# Altium footprint library Atlan.PcbLib: 283 footprints (part 15 of 18)
Each footprint in its own frame and in the unit in brackets; x right, y up, seen from the top. Pads: shape width x height; smd on the part's side, far side on the other; paste and mask are expansions set on the pad; w line width, h text height; cw(c..) or ccw(c..) is an arc to the next point about the centre after c.
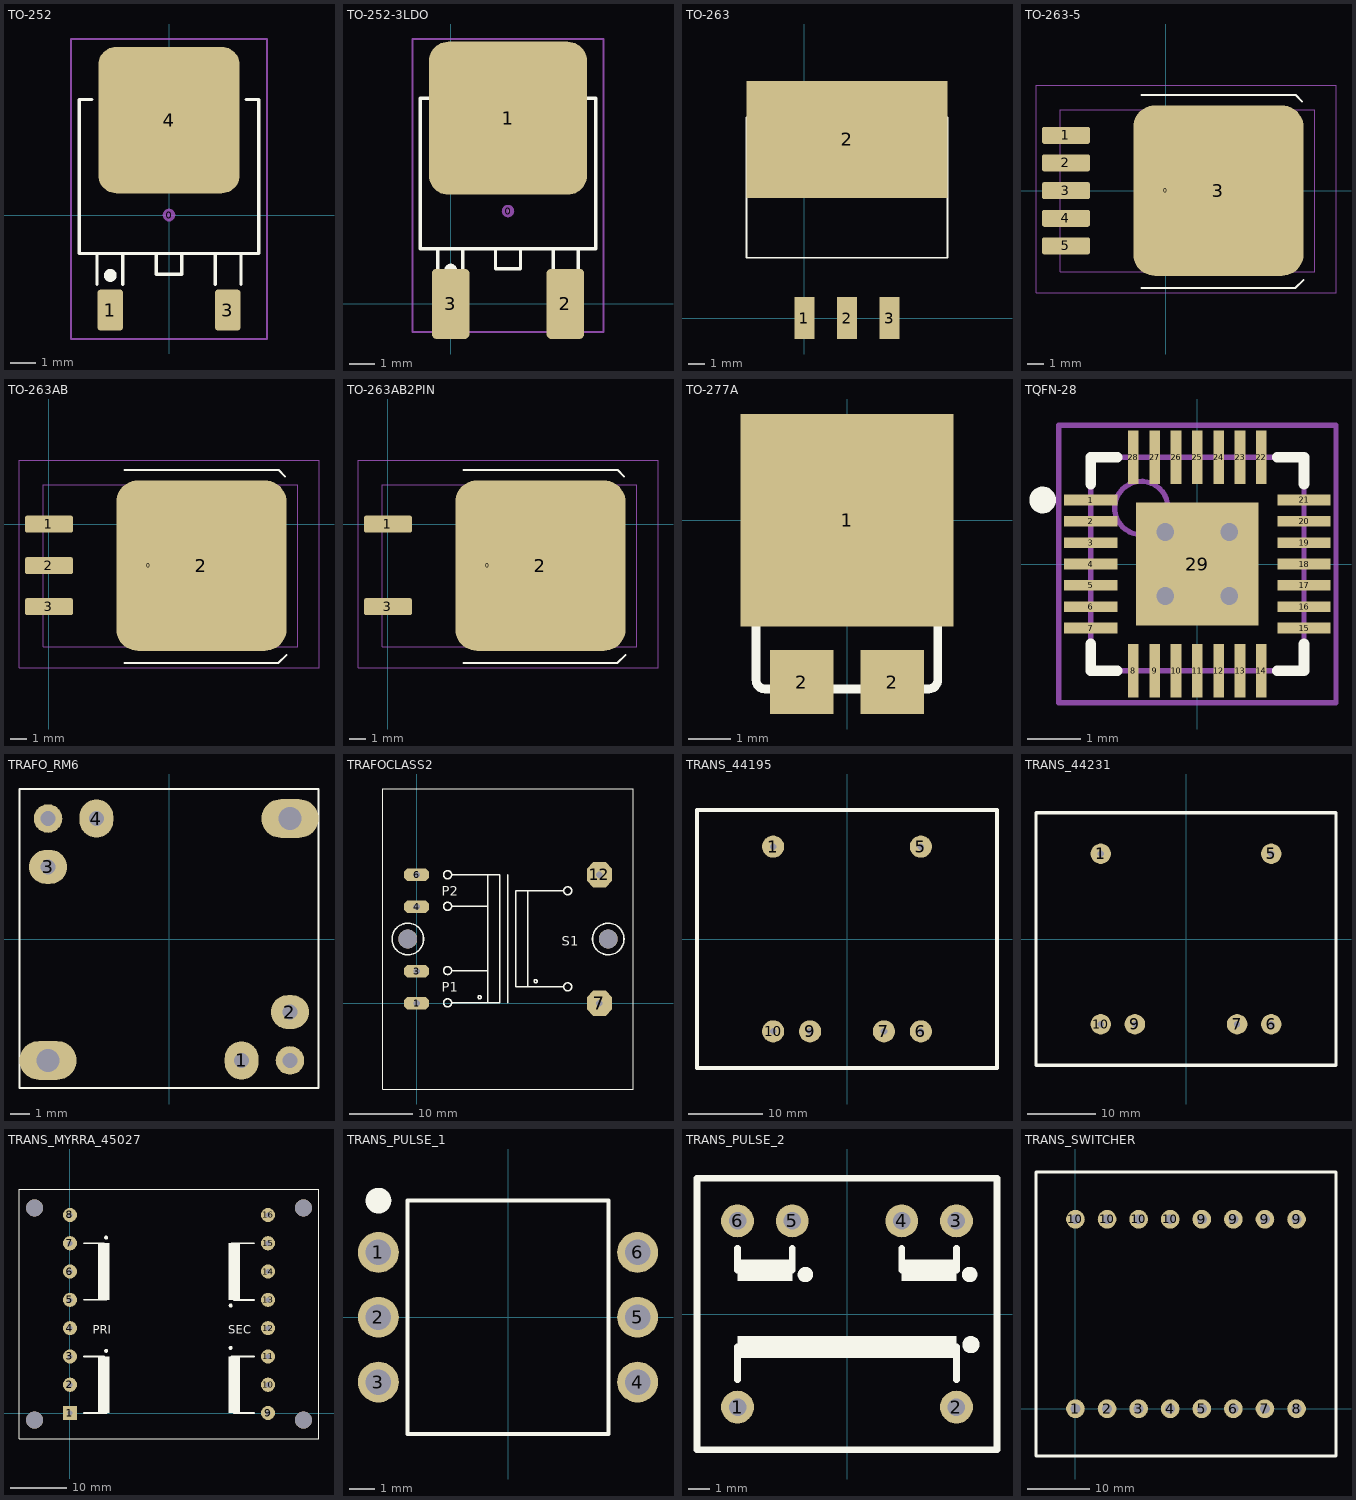
[diagram p14: the footprints below, top view; thin cyan lines are the x and y axes]

## TO-252 [mm] "D-PAK/TO-252-AA; 3 Leads (1 Cropped); Body 10.3 (inc. leads) x 6.7 mm (LxW max)"
height 2.38
pads (4):
  round 0.5 on Mech15: 0(0,0)
  rrect25% 1x1.6 smd: 1(-2.285,-3.7) 3(2.285,-3.7)
  rrect25% 5.5x5.7 smd: 4(0,3.7)
Top Overlay:
  circle w0.25: c-2.285,-2.35 r0.125
  lines w0.127: -3,4.5 -3.5,4.5 -3.5,-1.5 3.5,-1.5 3.5,4.5 3,4.5 ; -2.8,-2.7 -2.8,-1.5 -1.8,-1.5 -1.8,-2.7 ; 1.8,-2.7 1.8,-1.5 2.8,-1.5 2.8,-2.7 ; -0.5,-2.3 -0.5,-1.5 0.5,-1.5 0.5,-2.3 -0.5,-2.3
Mechanical 15:
  lines w0.076: -3.81,-4.826 -3.81,6.858 3.81,6.858 3.81,-4.826 -3.81,-4.826
3D body "DPAK.stp": height 2.31, standoff 0, extent -3.3,-3.951 3.3,5.762

## TO-252-3LDO [mm] "D-PAK/TO-252-AA; 3 Leads (1 Cropped); Body 10.3 (inc. leads) x 6.7 mm (LxW max)"
height 2.38
pads (4):
  round 0.5 on Mech15: 0(2.285,3.7)
  rrect25% 6.3x6.1 smd: 1(2.285,7.4)
  rrect25% 1.5x2.8 smd: 2(4.57,0) 3(0,0)
Top Overlay:
  circle w0.25: c0,1.35 r0.125
  lines w0.127: -0.715,8.2 -1.215,8.2 -1.215,2.2 5.785,2.2 5.785,8.2 5.285,8.2 ; -0.515,1 -0.515,2.2 0.485,2.2 0.485,1 ; 4.085,1 4.085,2.2 5.085,2.2 5.085,1 ; 1.785,1.4 2.785,1.4 2.785,2.2 1.785,2.2 1.785,1.4
Mechanical 15:
  lines w0.076: -1.525,-1.126 6.095,-1.126 6.095,10.558 -1.525,10.558 -1.525,-1.126
3D body "DPAK.stp": height 2.31, standoff 0, extent -1.015,-0.251 5.585,9.462

## TO-263 [mm]
pads (4):
  rect 1.2x2.5 smd: 1(0,0) 2(2.54,0) 3(5.08,0)
  rect 12x7 smd: 2(2.54,10.67)
Top Overlay:
  lines w0.1: -3.46,3.6 2.54,3.6 8.54,3.6 8.54,12 -3.46,12 -3.46,3.6
3D body: height 4.6, standoff 0, extent -3.5,3.6 8.6,12

## TO-263-5 [mm] "D-PAK/TO-263-5; 5 Leads; Body 14.4 (inc. leads) x 10.4 mm (LxW max)"
height 4.65
pads (7):
  round 0.5 on Mech15: 0(0,0)
  rrect25% 2.95x1.05 smd: 1(-6.15,3.41) 2(-6.15,1.705) 3(-6.15,0) 4(-6.15,-1.705) 5(-6.15,-3.41)
  rrect25% 10.5x10.5 smd: 3(3.25,0)
Top Overlay:
  lines w0.127: -1.5,-6 8,-6 8.5,-5.5 ; -1.5,5.9 8,5.9 8.4,5.5
Mechanical 13:
  lines w0.076: -6.49,-5 -6.49,5 9.18,5 9.18,-5 -6.49,-5
Mechanical 15:
  lines w0.076: -8,-6.3 -8,6.5 10.5,6.5 10.5,-6.3 -8,-6.3
3D body "TO-263-5.stp": height 4.56, standoff 0, extent -6.727,-5.08 7.288,5.08

## TO-263AB [mm]
pads (5):
  round 0.5 on Mech15: 0(6.15,-2.558)
  rrect25% 2.95x1.05 smd: 1(0,0) 2(0,-2.558) 3(0,-5.08)
  rrect25% 10.5x10.5 smd: 2(9.4,-2.558)
Top Overlay:
  lines w0.127: 4.65,-8.558 14.15,-8.558 14.65,-8.057 ; 4.65,3.343 14.15,3.343 14.55,2.942
Mechanical 13:
  lines w0.076: -0.34,-7.558 15.33,-7.558 15.33,2.442 -0.34,2.442 -0.34,-7.558
Mechanical 15:
  lines w0.076: -1.85,-8.858 16.65,-8.858 16.65,3.942 -1.85,3.942 -1.85,-8.858
3D body "SW3dPS-LTC DD-PAK.STEP": height 4.48, standoff 0, extent -1.208,-7.672 13.143,2.551

## TO-263AB2PIN [mm]
pads (4):
  round 0.5 on Mech15: 0(6.15,-2.558)
  rrect25% 2.95x1.05 smd: 1(0,0) 3(0,-5.08)
  rrect25% 10.5x10.5 smd: 2(9.4,-2.558)
Top Overlay:
  lines w0.127: 4.65,-8.558 14.15,-8.558 14.65,-8.057 ; 4.65,3.343 14.15,3.343 14.55,2.942
Mechanical 13:
  lines w0.076: -0.34,-7.558 -0.34,2.442 15.33,2.442 15.33,-7.558 -0.34,-7.558
Mechanical 15:
  lines w0.076: -1.85,-8.858 -1.85,3.942 16.65,3.942 16.65,-8.858 -1.85,-8.858
3D body "SW3dPS-LTC DD-PAK_2.STEP": height 4.48, standoff 0, extent -0.853,-7.666 13.498,2.558

## TO-277A [mm]
pads (3):
  rect 5x5 smd: 1(0,0)
  rect 1.5x1.5 smd: 2(-1.065,-3.805) 2(1.065,-3.805)
Top Overlay:
  lines w0.127: -2.178,-3.755 ccw(c-1.928,-3.755) -1.928,-4.005 ; -2.178,-3.755 -2.101,-3.755 ; -2.178,-3.755 -2.178,1.895 ; -2.178,1.895 cw(c-1.928,1.895) -1.928,2.145 ; -2.178,1.895 -2.101,1.895 ; -2.101,-3.755 ccw(c-1.925,-3.752) -1.928,-3.928 ; -2.101,-3.755 -2.101,1.895 ; -2.101,1.895 cw(c-1.925,1.893) -1.928,2.069 ; -1.928,-4.005 -1.928,-3.928 ; -1.928,-4.005 1.922,-4.005 ; -1.928,-3.928 1.922,-3.928 ; -1.928,2.069 1.922,2.069 ; -1.928,2.069 -1.928,2.145 ; -1.928,2.145 1.922,2.145 ; 1.922,-4.005 ccw(c1.922,-3.755) 2.172,-3.755 ; 1.922,-4.005 1.922,-3.928 ; 1.922,-3.928 ccw(c1.92,-3.752) 2.096,-3.755 ; 1.922,2.069 cw(c1.92,1.893) 2.096,1.895 ; 1.922,2.069 1.922,2.145 ; 1.922,2.145 cw(c1.922,1.895) 2.172,1.895 ; 2.096,-3.755 2.096,1.895 ; 2.096,-3.755 2.172,-3.755 ; 2.096,1.895 2.172,1.895 ; 2.172,-3.755 2.172,1.895
3D body "SW3dPS-TO-277A(SMPC).STEP": height 1.4, standoff 0.2, extent -2.375,-4.303 2.375,2.347

## TQFN-28 [mm]
height 0.75
pads (29):
  rect 1x0.2 smd: 1(-2,1.2) 2(-2,0.8) 3(-2,0.4) 4(-2,0) 5(-2,-0.4) 6(-2,-0.8) 7(-2,-1.2) 15(2,-1.2) 16(2,-0.8) 17(2,-0.4) 18(2,0) 19(2,0.4) 20(2,0.8) 21(2,1.2)
  rect 0.2x1 smd: 8(-1.2,-2) 9(-0.8,-2) 10(-0.4,-2) 11(0,-2) 12(0.4,-2) 13(0.8,-2) 14(1.2,-2) 22(1.2,2) 23(0.8,2) 24(0.4,2) 25(0,2) 26(-0.4,2) 27(-0.8,2) 28(-1.2,2)
  rect 2.3x2.3 smd: 29(0,0)
via 0.6,-0.6 diameter 0.66 hole 0.33
via -0.6,-0.6 diameter 0.66 hole 0.33
via 0.6,0.6 diameter 0.66 hole 0.33
via -0.6,0.6 diameter 0.66 hole 0.33
Top Overlay:
  circle w0.25: c-2.9,1.2 r0.125
  lines w0.2: -2,-1.5 -2,-2 -1.5,-2 ; -2,1.5 -2,2 -1.5,2 ; 1.5,-2 2,-2 2,-1.5 ; 1.5,2 2,2 2,1.5
Mechanical 13:
  circle w0.1: c-1.05,1.05 r0.5
  lines w0.1: -2,-2 2,-2 2,2 -2,2 -2,-2
Mechanical 15:
  lines w0.1: -0.5,0 0.5,0 ; 0,-0.5 0,0.5 ; -2.6,-2.6 2.6,-2.6 2.6,2.6 -2.6,2.6 -2.6,-2.6
3D body: height 0.75, standoff 0.02, extent -2,-2 2,2

## TRAFO_RM6 [mil]
height 511.81
pads (8):
  oval 70x79 hole 31.5: 1(150,-250) 4(-150,250)
  oval 79x70 hole 31.5: 2(250,-150) 3(-250,150)
  oval 118x80 hole 47.24: ""(-250,-250) ""(250,250)
  round 59 hole 31.5: ""(-250,250) ""(250,-250)
Top Overlay:
  lines w3.94: -308.82,-306.66 -308.82,311.02 308.82,311.02 308.82,-306.66 -308.82,-306.66
3D body "User Library-RM6-1.STEP": height 492.13, standoff -187.86, extent -308.82,-306.66 308.82,311.02

## TRAFOCLASS2 [mm]
pads (8):
  oct 4x2 hole 1: 1(0,0) 3(0,5.1) 4(0,15.3) 6(0,20.4)
  oct 4x4 hole 1: 7(29,0) 12(29,20.4)
  round 3 hole 3 unplated: ""(-1.4,10.2) ""(30.4,10.2)
Top Overlay:
  drawing of 385 lines, arcs and shapes, not listed
  text "P2" at 4,17.1 h1.52
  text "P1" at 4,1.8 h1.52
  text "S1" at 23,9.1 h1.52

## TRANS_44195 [mm]
height 28.1
pads (6):
  round 3 hole 0.9: 1(-10,12.5) 5(10,12.5) 6(10,-12.5) 7(5,-12.5) 9(-5,-12.5) 10(-10,-12.5)
Top Overlay:
  lines w0.5: -20.3,-17.45 -20.3,17.45 20.3,17.45 20.3,-17.45 -20.3,-17.45
3D body: height 28.1, standoff 0, extent -20.3,-17.45 20.3,17.45

## TRANS_44231 [mm]
height 28.1
pads (6):
  round 3 hole 0.9: 1(-12.5,12.5) 5(12.5,12.5) 6(12.5,-12.5) 7(7.5,-12.5) 9(-7.5,-12.5) 10(-12.5,-12.5)
Top Overlay:
  lines w0.5: -22,-18.5 22,-18.5 22,18.5 -22,18.5 -22,-18.5
3D body: height 32.3, standoff 0, extent -22,-18.5 22,18.5

## TRANS_MYRRA_45027 [mm] "Transformer"
height 22
pads (20):
  rect 2.5x2.5 hole 0.9: 1(0,0)
  round 2.5 hole 0.9: 2(0,5) 3(0,10) 4(0,15) 5(0,20) 6(0,25) 7(0,30) 8(0,35) 9(35,0) 10(35,5) 11(35,10) 12(35,15) 13(35,20) 14(35,25) 15(35,30) 16(35,35)
  round 3 hole 3 unplated: ""(-6.25,-1.25) ""(-6.25,36.25) ""(41.25,-1.25) ""(41.25,36.25)
Top Overlay:
  circle w0.5: c6.4,11 r0.1
  circle w0.5: c6.4,31 r0.1
  circle w0.5: c28.4,11.5 r0.1
  circle w0.5: c28.4,19 r0.1
  region: 7,0 7,10 5,10 5,0
  region: 7,20 7,30 5,30 5,20
  region: 28,10 28,0 30,0 30,10
  region: 28,30 28,20 30,20 30,30
  lines w0.2: -9,-4.5 -9,39.5 44,39.5 44,-4.5 -9,-4.5
  lines w0.3: 2.5,0 6.5,0 ; 2.5,20 6.5,20 ; 28.5,10 32.5,10 ; 28.5,30 32.5,30
  lines w0.33: 2.5,10 6,10 ; 2.5,30 6,30 ; 29,0 32.5,0 ; 29,20 32.5,20
  text "PRI" at 4,14 h1.5
  text "SEC" at 28,14 h1.5
3D body: height 22, standoff 0, extent -9,-4.5 44,39.5

## TRANS_PULSE_1 [mm]
pads (6):
  round 1.6 hole 1: 1(-5.08,2.54) 2(-5.08,0) 3(-5.08,-2.54) 4(5.08,-2.54) 5(5.08,0) 6(5.08,2.54)
Top Overlay:
  circle w0.5: c-5.08,4.572 r0.254
  lines w0.15: -3.937,-4.572 -3.937,4.572 3.937,4.572 3.937,-4.572 -3.937,-4.572

## TRANS_PULSE_2 [mm]
height 13
pads (6):
  round 1.5 hole 0.8: 1(-5,-4.25) 2(5,-4.25) 3(5,4.25) 4(2.5,4.25) 5(-2.5,4.25) 6(-5,4.25)
Top Overlay:
  circle w0.5: c-1.9,1.8 r0.1
  circle w0.5: c5.6,1.8 r0.1
  circle w0.5: c5.659,-1.4 r0.141
  rectangle: -5,-2 5,-1
  rectangle: -5,1.5 -2.5,2.5
  rectangle: 2.5,1.5 5,2.5
  lines w0.3: -5,-3 -5,-1.5 ; -5,2 -5,3 ; -2.5,2 -2.5,3 ; 2.5,2 2.5,3 ; 5,-3 5,-1.5 ; 5,2 5,3 ; -6.85,-6.2 -6.85,6.2 6.85,6.2 6.85,-6.2 -6.85,-6.2

## TRANS_SWITCHER [mm]
pads (16):
  round 3 hole 1.6: 1(0,0) 2(5.08,0) 3(10.16,0) 4(15.24,0) 5(20.32,0) 6(25.4,0) 7(30.48,0) 8(35.56,0) 9(20.32,30.48) 9(25.4,30.48) 9(30.48,30.48) 9(35.56,30.48) 10(0,30.48) 10(5.08,30.48) 10(10.16,30.48) 10(15.24,30.48)
Top Overlay:
  lines w0.5: -6.35,-7.62 41.91,-7.62 41.91,38.1 -6.35,38.1 -6.35,-7.62